# Altium footprint library Connectors.PcbLib: 66 footprints (part 3 of 5)
Each footprint in its own frame and in the unit in brackets; x right, y up, seen from the top. Pads: shape width x height; smd on the part's side, far side on the other; paste and mask are expansions set on the pad; w line width, h text height; cw(c..) or ccw(c..) is an arc to the next point about the centre after c.
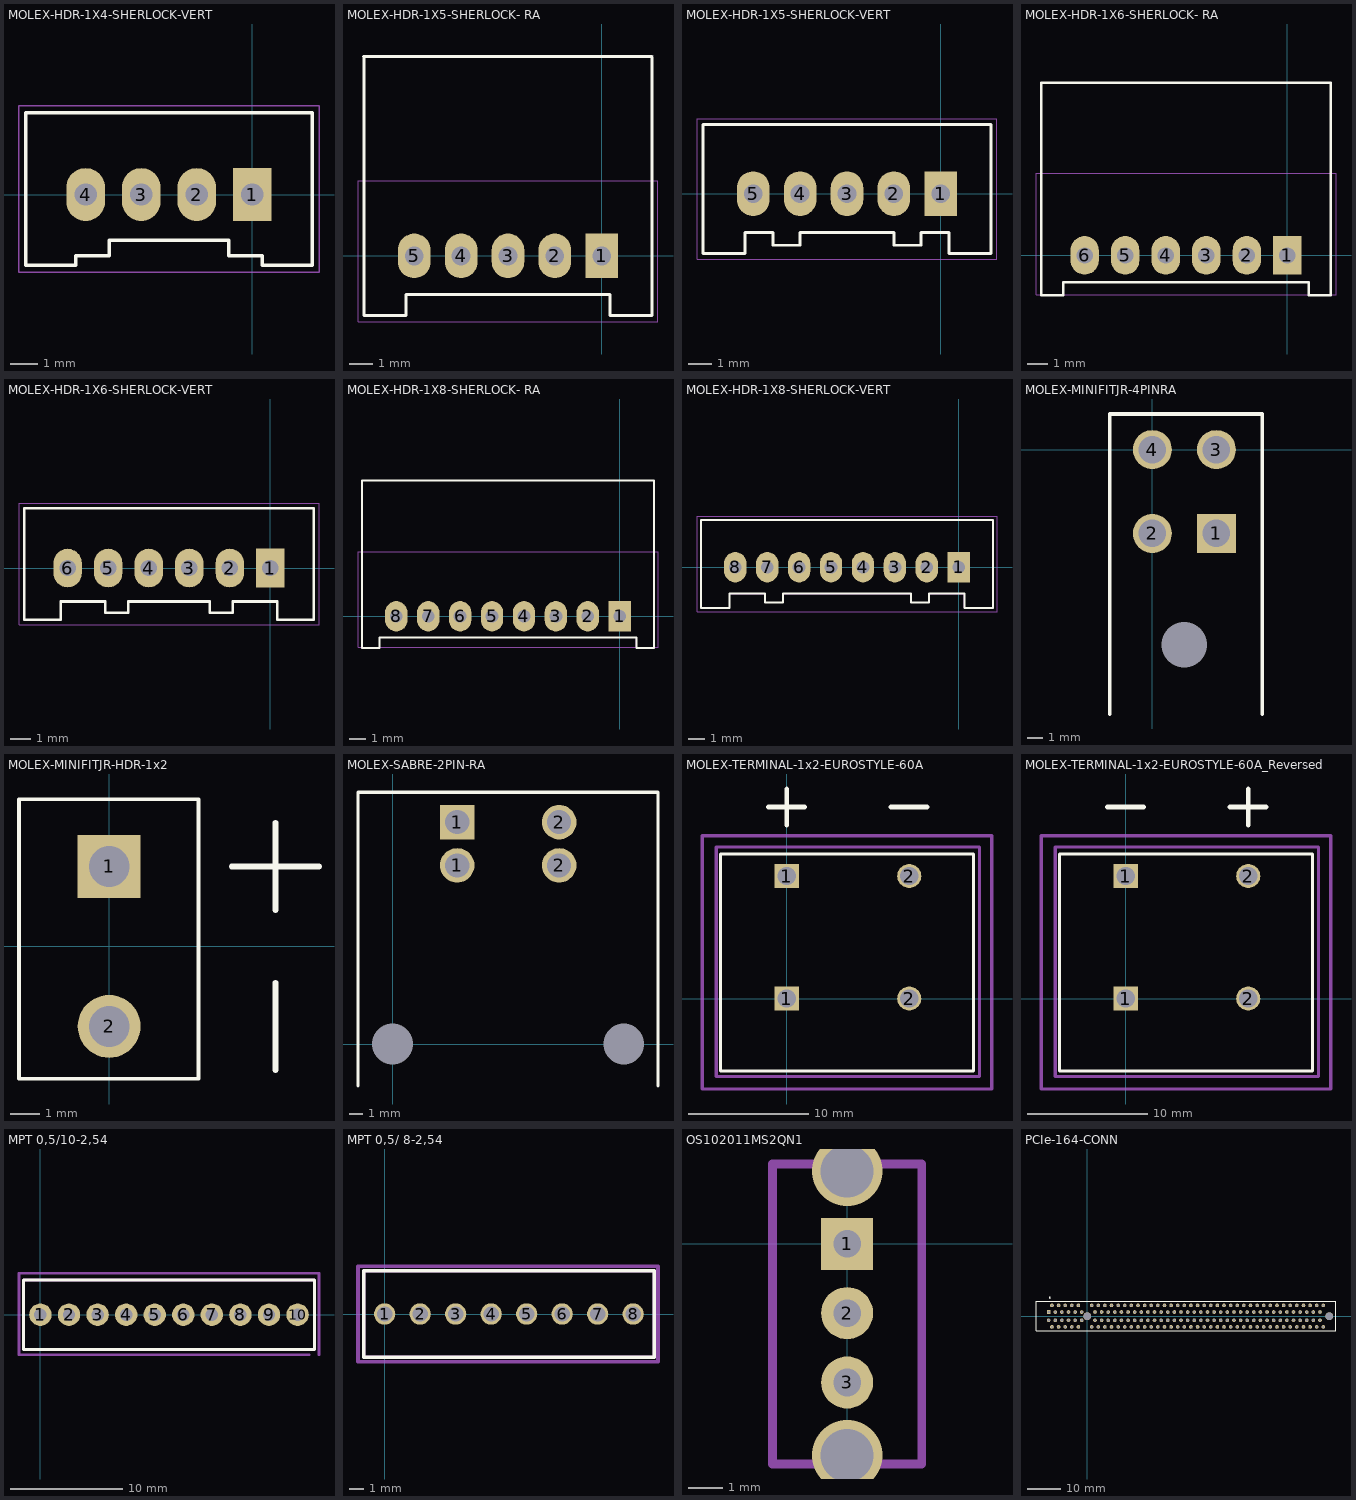
[diagram p2: the footprints below, top view; thin cyan lines are the x and y axes]

## MOLEX-HDR-1X4-SHERLOCK-VERT [mm]
height 8.5
pads (4):
  rect 1.397x1.905 hole 0.8: 1(0,0)
  oval 1.397x1.905 hole 0.8: 2(-2,0) 3(-4,0) 4(-6,0)
Top Overlay:
  lines w0.127: -8.15,-2.55 -6.35,-2.55 -6.35,-2.2 -5.15,-2.2 -5.15,-1.65 -0.85,-1.65 -0.85,-2.2 0.35,-2.2 0.35,-2.55 2.15,-2.55 2.15,2.95 -8.15,2.95 -8.15,-2.55
Mechanical 13:
  lines w0.05: -8.15,-2.55 -8.15,2.95 2.15,2.95 2.15,-2.55 0.35,-2.55 0.35,-2.2 -0.85,-2.2 -0.85,-1.65 -5.15,-1.65 -5.15,-2.2 -6.35,-2.2 -6.35,-2.55 -8.15,-2.55
Mechanical 15:
  lines w0.05: -8.4,-2.8 -8.4,3.2 2.4,3.2 2.4,-2.8 -8.4,-2.8
3D body "molex-sherlock-4v-353620450.stp": height 8.5, standoff -3.3, extent -8.128,-2.565 2.172,2.985

## MOLEX-HDR-1X5-SHERLOCK- RA [mm]
height 8.5
pads (5):
  rect 1.397x1.905 hole 0.8: 1(0,0)
  oval 1.397x1.905 hole 0.8: 2(-2,0) 3(-4,0) 4(-6,0) 5(-8,0)
Top Overlay:
  lines w0.127: -10.15,2.642 -10.15,8.499 -10.16,8.509 2.134,8.509 2.15,8.493 2.15,2.95 2.15,-2.55 0.35,-2.55 0.35,-1.65 ; -10.15,2.95 -10.15,-2.55 -8.35,-2.55 -8.35,-1.65 -7.15,-1.65 0.35,-1.65 ; -6,-1.65 -2,-1.65 ; -0.85,-1.65 0.35,-1.65
Mechanical 13:
  lines w0.05: -10.15,2.95 -10.15,-2.55 -8.35,-2.55 -8.35,-1.65 -7.15,-1.65 ; -6,-1.65 -2,-1.65 ; -0.85,-1.65 0.35,-1.65 0.35,-2.55 2.15,-2.55 2.15,2.95
Mechanical 15:
  lines w0.05: -10.4,-2.8 2.4,-2.8 2.4,3.2 -10.4,3.2 -10.4,-2.8
3D body "353630560.stp": height 5.54, standoff -3.16, extent -10.16,-1.956 2.14,8.544

## MOLEX-HDR-1X5-SHERLOCK-VERT [mm]
height 8.5
pads (5):
  rect 1.397x1.905 hole 0.8: 1(0,0)
  oval 1.397x1.905 hole 0.8: 2(-2,0) 3(-4,0) 4(-6,0) 5(-8,0)
Top Overlay:
  lines w0.127: -10.15,-2.55 -10.15,2.95 2.15,2.95 2.15,-2.55 0.35,-2.55 0.35,-1.65 -0.85,-1.65 -0.85,-2.2 -2,-2.2 -2,-1.65 -6,-1.65 -6,-2.2 -7.15,-2.2 -7.15,-1.65 -8.35,-1.65 -8.35,-2.55 -10.15,-2.55
Mechanical 13:
  lines w0.05: -10.15,-2.55 -8.35,-2.55 -8.35,-1.65 -7.15,-1.65 -7.15,-2.2 -6,-2.2 -6,-1.65 -2,-1.65 -2,-2.2 -0.85,-2.2 -0.85,-1.65 0.35,-1.65 0.35,-2.55 2.15,-2.55 2.15,2.95 -10.15,2.95 -10.15,-2.55
Mechanical 15:
  lines w0.05: -10.4,-2.8 2.4,-2.8 2.4,3.2 -10.4,3.2 -10.4,-2.8
3D body "molex-sherlock-5v-353620550.stp": height 8.5, standoff -3.3, extent -10.16,-2.565 2.14,2.985

## MOLEX-HDR-1X6-SHERLOCK- RA [mm]
height 8.5
pads (6):
  rect 1.397x1.905 hole 0.8: 1(0,0)
  oval 1.397x1.905 hole 0.8: 2(-2,0) 3(-4,0) 4(-6,0) 5(-8,0) 6(-10,0)
Top Overlay:
  lines w0.127: -12.15,2.642 -12.15,8.499 ; -12.15,2.95 -12.15,-1.975 -11.05,-1.975 -11.05,-1.325 1.05,-1.325 1.05,-1.975 2.15,-1.975 2.15,2.95 2.15,8.493 2.134,8.509 -12.15,8.509
Mechanical 13:
  lines w0.05: -12.15,8.525 -12.15,-1.975 -11.05,-1.975 -11.05,-1.325 -2,-1.325 1.05,-1.325 1.05,-1.975 2.15,-1.975 2.15,8.525
  lines w0.051: -12.15,8.525 2.15,8.525
Mechanical 15:
  lines w0.05: -12.4,-1.95 2.4,-1.95 2.4,4.05 -12.4,4.05 -12.4,-1.95
3D body "353630660.stp": height 5.54, standoff -3.16, extent -12.15,-1.95 2.15,8.55

## MOLEX-HDR-1X6-SHERLOCK-VERT [mm]
height 8.5
pads (6):
  rect 1.397x1.905 hole 0.8: 1(0,0)
  oval 1.397x1.905 hole 0.8: 2(-2,0) 3(-4,0) 4(-6,0) 5(-8,0) 6(-10,0)
Top Overlay:
  lines w0.127: -12.15,-2.55 -12.15,2.95 2.15,2.95 2.15,-2.55 0.35,-2.55 0.35,-1.65 -1.85,-1.65 -1.85,-2.2 -3,-2.2 -3,-1.65 -7,-1.65 -7,-2.2 -8.15,-2.2 -8.15,-1.65 -10.35,-1.65 -10.35,-2.55 -12.15,-2.55
Mechanical 13:
  lines w0.05: -12.15,-2.55 -12.15,2.95 2.15,2.95 2.15,-2.55 0.35,-2.55 0.35,-1.65 -1.85,-1.65 -1.85,-2.2 -3,-2.2 -3,-1.65 -7,-1.65 -7,-2.2 -8.15,-2.2 -8.15,-1.65 -10.35,-1.65 -10.35,-2.55 -12.15,-2.55
Mechanical 15:
  lines w0.05: -12.4,-2.8 -12.4,3.2 2.4,3.2 2.4,-2.8 -12.4,-2.8
3D body "molex-sherlock-6v-353620650.stp": height 8.5, standoff -3.3, extent -12.166,-2.616 2.134,2.934

## MOLEX-HDR-1X8-SHERLOCK- RA [mm] "8 Positions Header Connector 0.079\" (2.00mm) Through Hole, Right Angle Tin"
height 5.55
pads (8):
  rect 1.397x1.905 hole 0.8: 1(0,0)
  oval 1.397x1.905 hole 0.8: 2(-2,0) 3(-4,0) 4(-6,0) 5(-8,0) 6(-10,0) 7(-12,0) 8(-14,0)
Top Overlay:
  lines w0.127: -16.15,2.642 -16.15,8.499 ; -16.15,2.95 -16.15,-1.975 -15.05,-1.975 -15.05,-1.325 1.05,-1.325 1.05,-1.975 2.15,-1.975 2.15,2.95 2.15,8.493 2.134,8.509 -16.15,8.509
Mechanical 13:
  lines w0.05: -16.15,8.525 -16.15,-1.975 -15.05,-1.975 -15.05,-1.325 -2,-1.325 1.05,-1.325 1.05,-1.975 2.15,-1.975 2.15,8.525
  lines w0.051: -16.15,8.525 2.15,8.525
Mechanical 15:
  lines w0.05: -16.4,-1.95 2.4,-1.95 2.4,4.05 -16.4,4.05 -16.4,-1.95
3D body "353630860.stp": height 5.5, standoff -3.2, extent -16.16,-1.956 2.14,8.544

## MOLEX-HDR-1X8-SHERLOCK-VERT [mm] "8 Positions Header Connector 0.079\" (2.00mm) Through Hole Tin"
height 8.5
pads (8):
  rect 1.397x1.905 hole 0.8: 1(0,0)
  oval 1.397x1.905 hole 0.8: 2(-2,0) 3(-4,0) 4(-6,0) 5(-8,0) 6(-10,0) 7(-12,0) 8(-14,0)
Top Overlay:
  lines w0.127: -16.15,-2.55 -14.35,-2.55 -14.35,-1.65 -12.15,-1.65 -12.15,-2.2 -11,-2.2 -11,-1.65 -3,-1.65 -3,-2.2 -1.85,-2.2 -1.85,-1.65 0.35,-1.65 0.35,-2.55 2.15,-2.55 2.15,2.95 -16.15,2.95 -16.15,-2.55
Mechanical 13:
  lines w0.05: -16.15,-2.55 -14.35,-2.55 -14.35,-1.65 -12.15,-1.65 -12.15,-2.2 -11,-2.2 -11,-1.65 -3,-1.65 -3,-2.2 -1.85,-2.2 -1.85,-1.65 0.35,-1.65 0.35,-2.55 2.15,-2.55 2.15,2.95 -16.15,2.95 -16.15,-2.55
Mechanical 15:
  lines w0.05: -16.4,-2.8 2.4,-2.8 2.4,3.2 -16.4,3.2 -16.4,-2.8
3D body "353620850.stp": height 9.25, standoff -2.55, extent -16.141,-2.565 2.159,2.985

## MOLEX-MINIFITJR-4PINRA [mm] "4 position, right angle, connector"
pads (5):
  rect 2.562x2.562 hole 1.8: 1(4.2,-5.5)
  round 2.562 hole 1.8: 2(0,-5.5) 3(4.2,0) 4(0,0)
  round 0 hole 3: ""(2.1,-12.8)
Top Overlay:
  lines w0.254: -2.8,-17.348 -2.8,2.337 7.214,2.337 7.214,-17.348
3D body "039301040.stp": height 11.4, standoff -3.6, extent -2.685,-19.391 7.315,0.544

## MOLEX-MINIFITJR-HDR-1x2 [mm] "MINIFITJRHDR VT DR O/PGS 2POS"
height 12.8
pads (2):
  rect 2.162x2.162 hole 1.4: 1(0,2.75)
  round 2.162 hole 1.4: 2(0,-2.75)
Top Overlay:
  lines w0.127: -3.099,-4.545 -3.099,5.055 3.073,5.055 3.073,-4.545 -3.099,-4.545
  lines w0.2: 4.215,2.75 7.215,2.75 ; 5.715,-4.25 5.715,-1.25 ; 5.715,1.25 5.715,4.25
3D body "039310020.stp": height 12.8, standoff -3.5, extent -3.101,-5.957 3.099,5.043

## MOLEX-SABRE-2PIN-RA [mm] "2 position, right angle, connector"
pads (6):
  round 2.542 hole 1.78: 1(4.75,13.13) 2(12.24,13.13) 2(12.24,16.31)
  rect 2.542x2.542 hole 1.78: 1(4.75,16.31)
  round 0 hole 3: ""(0,0) ""(16.99,0)
Top Overlay:
  lines w0.254: -2.54,-3.048 -2.54,18.491 19.507,18.491 19.507,-3.048
3D body "431601102.stp": height 13.37, standoff -3.83, extent -2.057,-3.035 19.025,16.751

## MOLEX-TERMINAL-1x2-EUROSTYLE-60A [mm]
height 29.7
pads (4):
  rect 2x2 hole 1.52: 1(0,0) 1(0,10.16)
  round 2 hole 1.52: 2(10.16,0) 2(10.16,10.16)
Top Overlay:
  lines w0.254: -5.5,-6 -5.5,12 15.5,12 15.5,-6 -5.5,-6
  lines w0.4: -1.5,15.875 1.5,15.875 ; 0,14.375 0,17.375 ; 8.66,15.875 11.66,15.875
Mechanical 13:
  lines w0.254: -5.84,-6.45 16,-6.45 16,12.55 -5.84,12.55 -5.84,-6.45
Mechanical 15:
  lines w0.254: -7,-7.5 -7,13.5 17,13.5 17,-7.5 -7,-7.5
3D body "399700102.stp": height 29.72, standoff -3.68, extent -5.947,-6.443 15.897,12.353

## MOLEX-TERMINAL-1x2-EUROSTYLE-60A_Reversed [mm]
height 29.7
pads (4):
  rect 2x2 hole 1.52: 1(0,0) 1(0,10.16)
  round 2 hole 1.52: 2(10.16,0) 2(10.16,10.16)
Top Overlay:
  lines w0.254: -5.5,-6 -5.5,12 15.5,12 15.5,-6 -5.5,-6
  lines w0.4: -1.5,15.875 1.5,15.875 ; 8.66,15.875 11.66,15.875 ; 10.16,14.375 10.16,17.375
Mechanical 13:
  lines w0.254: -5.84,-6.45 16,-6.45 16,12.55 -5.84,12.55 -5.84,-6.45
Mechanical 15:
  lines w0.254: -7,-7.5 -7,13.5 17,13.5 17,-7.5 -7,-7.5
3D body "399700102.stp": height 29.72, standoff -3.68, extent -5.947,-6.443 15.897,12.353

## MPT 0,5/10-2,54 [mm] "CONN TERM BLOCK 2.54MM 10POS"
height 8.5
pads (10):
  round 2 hole 1.1: 1(0,0) 2(2.54,0) 3(5.08,0) 4(7.62,0) 5(10.16,0) 6(12.7,0) 7(15.24,0) 8(17.78,0) 9(20.32,0) 10(22.86,0)
Top Overlay:
  lines w0.254: 24.205,-3.1 24.36,-2.945 ; -1.5,-3.1 -1.5,3.1 24.36,3.1 24.36,-3.1 -1.5,-3.1
Mechanical 13:
  lines w0.254: -1.5,-3.1 24.36,-3.1 24.36,3.1 -1.5,3.1 -1.5,-3.1
Mechanical 15:
  lines w0.254: 23.876,-3.556 -1.905,-3.556 -1.905,3.683 24.765,3.683 24.765,-3.556

## MPT 0,5/ 8-2,54 [mil] "CONN TERM BLOCK 2.54MM 8POS"
pads (8):
  round 60 hole 43.31: 1(0,0) 2(100,0) 3(200,0) 4(300,0) 5(400,0) 6(500,0) 7(600,0) 8(700,0)
Top Overlay:
  lines w10: -59.06,-122.05 -59.06,122.05 759.06,122.05 759.06,-122.05 -59.06,-122.05
Mechanical 13:
  lines w10: -59.06,-122.05 -59.06,122.05 759.06,122.05 759.06,-122.05 -59.06,-122.05
Mechanical 15:
  lines w10: -75,-135 770,-135 770,135 -75,135 -75,-135

## OS102011MS2QN1 [mm] "SWITCH SLIDE SPDT 100MA 12V"
height 4
pads (3):
  rect 1.5x1.5 hole 0.8: 1(0,0)
  round 1.5 hole 0.8: 2(0,-2) 3(0,-4)
via 0,-6.1 diameter 2.032 hole 1.524
via 0,2.1 diameter 2.032 hole 1.524
Mechanical 15:
  lines w0.254: -2.159,-6.35 2.15,-6.35 2.15,2.286 ; -2.15,-6.35 -2.15,2.3 2.15,2.3

## PCIe-164-CONN [mm] "PCIe x16 164 Position Board Connector"
height 11.25
pads (166):
  rect 1.1x1.1 hole 0.7: 1(-11.65,1.25)
  round 1.1 hole 0.7: 2(-10.65,3.25) 3(-9.65,1.25) 4(-8.65,3.25) 5(-7.65,1.25) 6(-6.65,3.25) 7(-5.65,1.25) 8(-4.65,3.25) 9(-3.65,1.25) 10(-2.65,3.25) 11(-1.65,1.25) 12(1.35,3.25) 13(2.35,1.25) 14(3.35,3.25) 15(4.35,1.25) 16(5.35,3.25) 17(6.35,1.25) 18(7.35,3.25) 19(8.35,1.25) 20(9.35,3.25) 21(10.35,1.25) 22(11.35,3.25) 23(12.35,1.25) 24(13.35,3.25) 25(14.35,1.25) 26(15.35,3.25) 27(16.35,1.25) 28(17.35,3.25) 29(18.35,1.25) 30(19.35,3.25) 31(20.35,1.25) 32(21.35,3.25) 33(22.35,1.25) 34(23.35,3.25) 35(24.35,1.25) 36(25.35,3.25) 37(26.35,1.25) 38(27.35,3.25) 39(28.35,1.25) 40(29.35,3.25) 41(30.35,1.25) 42(31.35,3.25) 43(32.35,1.25) 44(33.35,3.25) 45(34.35,1.25) 46(35.35,3.25) 47(36.35,1.25) 48(37.35,3.25) 49(38.35,1.25) 50(39.35,3.25) 51(40.35,1.25) 52(41.35,3.25) 53(42.35,1.25) 54(43.35,3.25) 55(44.35,1.25) 56(45.35,3.25) 57(46.35,1.25) 58(47.35,3.25) 59(48.35,1.25) 60(49.35,3.25) 61(50.35,1.25) 62(51.35,3.25) 63(52.35,1.25) 64(53.35,3.25) 65(54.35,1.25) 66(55.35,3.25) 67(56.35,1.25) 68(57.35,3.25) 69(58.35,1.25) 70(59.35,3.25) 71(60.35,1.25) 72(61.35,3.25) 73(62.35,1.25) 74(63.35,3.25) 75(64.35,1.25) 76(65.35,3.25) 77(66.35,1.25) 78(67.35,3.25) 79(68.35,1.25) 80(69.35,3.25) 81(70.35,1.25) 82(71.35,3.25) 83(-11.65,-1.25) 84(-10.65,-3.25) 85(-9.65,-1.25) 86(-8.65,-3.25) 87(-7.65,-1.25) 88(-6.65,-3.25) 89(-5.65,-1.25) 90(-4.65,-3.25) 91(-3.65,-1.25) 92(-2.65,-3.25) 93(-1.65,-1.25) 94(1.35,-3.25) 95(2.35,-1.25) 96(3.35,-3.25) 97(4.35,-1.25) 98(5.35,-3.25) 99(6.35,-1.25) 100(7.35,-3.25) 101(8.35,-1.25) 102(9.35,-3.25) 103(10.35,-1.25) 104(11.35,-3.25) 105(12.35,-1.25) 106(13.35,-3.25) 107(14.35,-1.25) 108(15.35,-3.25) 109(16.35,-1.25) 110(17.35,-3.25) 111(18.35,-1.25) 112(19.35,-3.25) 113(20.35,-1.25) 114(21.35,-3.25) 115(22.35,-1.25) 116(23.35,-3.25) 117(24.35,-1.25) 118(25.35,-3.25) 119(26.35,-1.25) 120(27.35,-3.25) 121(28.35,-1.25) 122(29.35,-3.25) 123(30.35,-1.25) 124(31.35,-3.25) 125(32.35,-1.25) 126(33.35,-3.25) 127(34.35,-1.25) 128(35.35,-3.25) 129(36.35,-1.25) 130(37.35,-3.25) 131(38.35,-1.25) 132(39.35,-3.25) 133(40.35,-1.25) 134(41.35,-3.25) 135(42.35,-1.25) 136(43.35,-3.25) 137(44.35,-1.25) 138(45.35,-3.25) 139(46.35,-1.25) 140(47.35,-3.25) 141(48.35,-1.25) 142(49.35,-3.25) 143(50.35,-1.25) 144(51.35,-3.25) 145(52.35,-1.25) 146(53.35,-3.25) 147(54.35,-1.25) 148(55.35,-3.25) 149(56.35,-1.25) 150(57.35,-3.25) 151(58.35,-1.25) 152(59.35,-3.25) 153(60.35,-1.25) 154(61.35,-3.25) 155(62.35,-1.25) 156(63.35,-3.25) 157(64.35,-1.25) 158(65.35,-3.25) 159(66.35,-1.25) 160(67.35,-3.25) 161(68.35,-1.25) 162(69.35,-3.25) 163(70.35,-1.25) 164(71.35,-3.25)
  round 2.35 hole 2.35 unplated: ""(0,0) ""(73.15,0)
Top Overlay:
  circle w0.25: c-11.303,5.588 r0.125
  lines w0.2: -15.469,-4.394 75.184,-4.394 75.184,4.572 -15.469,4.572 -15.469,-4.394
3D body "877159306.stp": height 10.06, standoff -5.54, extent -14.605,-5.136 74.395,3.714